# Altium footprint library 10A_Motor_Driver.PcbLib: 68 footprints (part 1 of 5)
Each footprint in its own frame and in the unit in brackets; x right, y up, seen from the top. Pads: shape width x height; smd on the part's side, far side on the other; paste and mask are expansions set on the pad; w line width, h text height; cw(c..) or ccw(c..) is an arc to the next point about the centre after c.
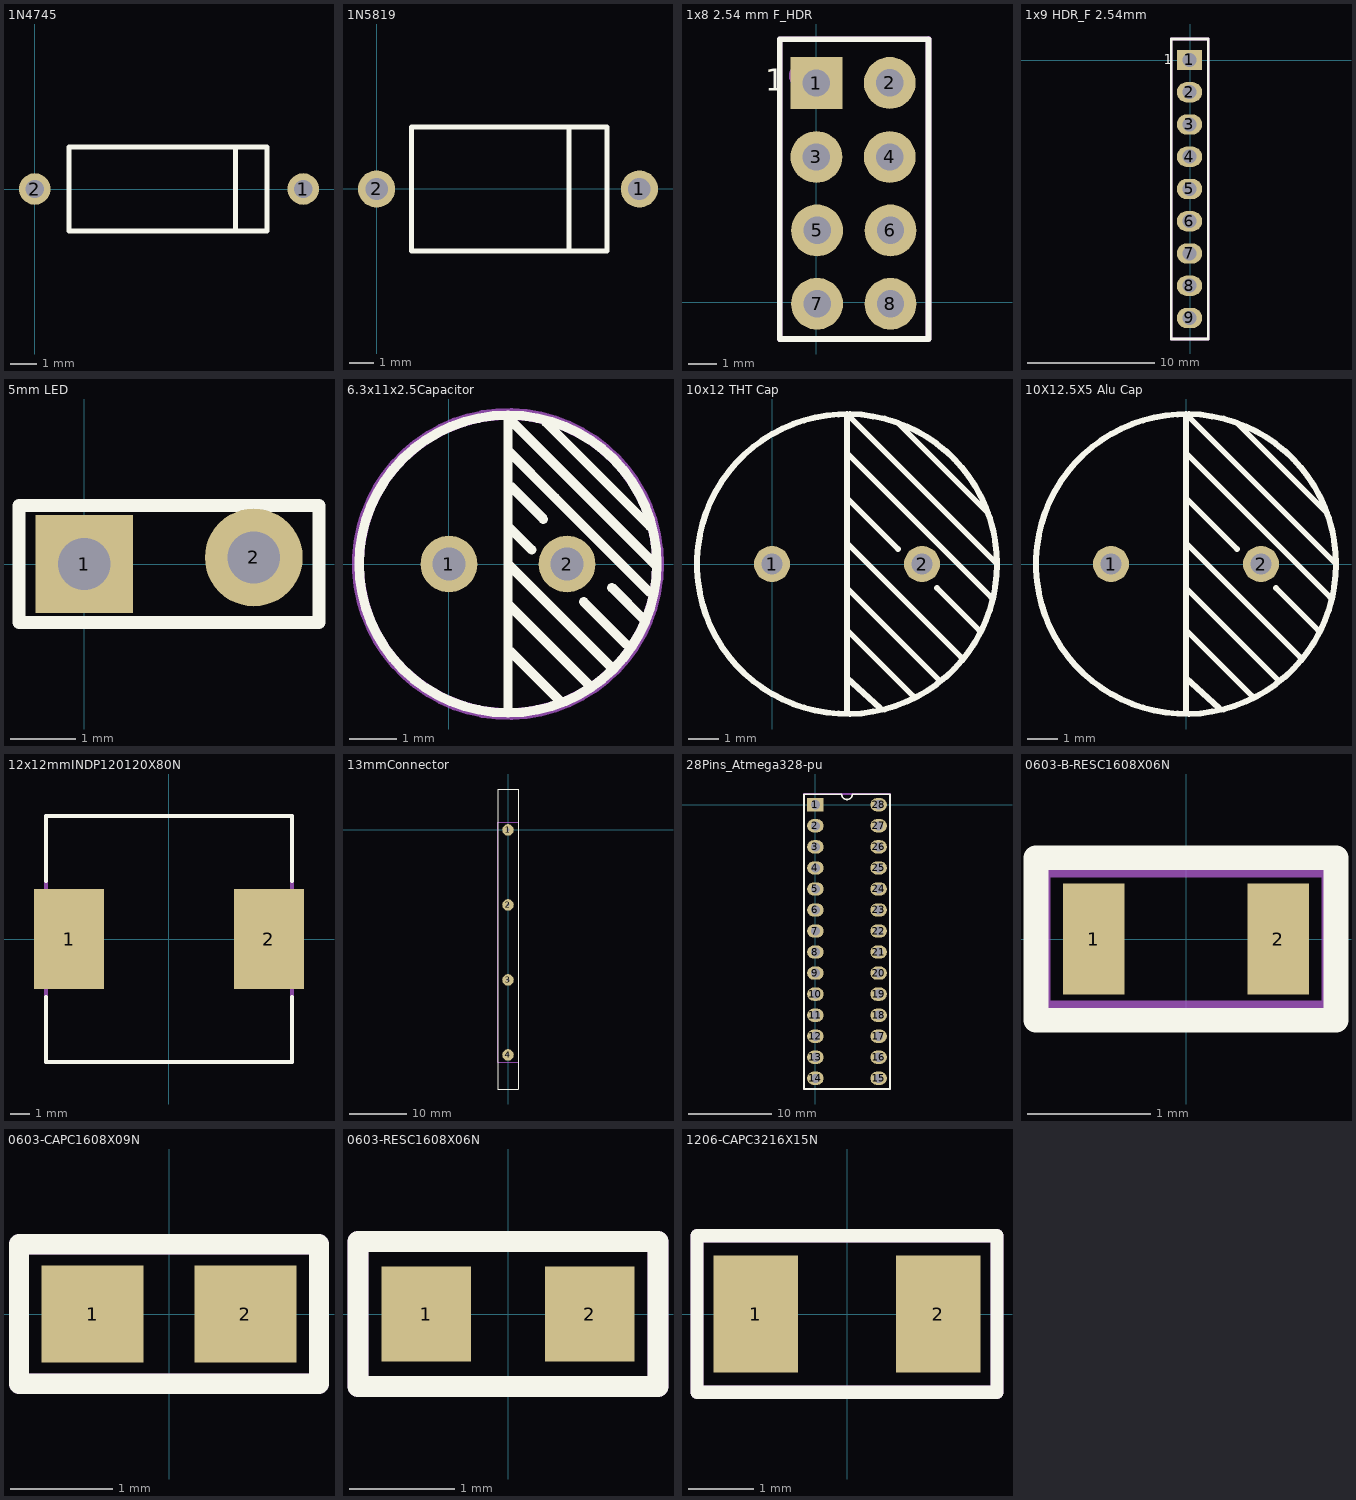
[diagram p0: the footprints below, top view; thin cyan lines are the x and y axes]

## 1N4745 [mm]
pads (2):
  round 1.2 hole 0.7: 1(10.2,0) 2(0,0)
Top Overlay:
  lines w0.2: 7.625,-1.6 7.625,1.6 ; 1.3,-1.6 8.825,-1.6 8.825,1.6 1.3,1.6 1.3,-1.6
3D body "User Library-Silicone Diode 3_9x2_6.step": height 2.83, standoff -1.28, extent -0.3,-1.352 10.42,1.3

## 1N5819 [mm]
pads (2):
  round 1.5 hole 0.9: 1(10.6,0) 2(0,0)
Top Overlay:
  lines w0.2: 7.758,-2.5 7.758,2.5 ; 1.4,-2.5 9.3,-2.5 9.3,2.5 1.4,2.5 1.4,-2.5
3D body "User Library-1N5819.step": height 5.08, standoff -2.28, extent -0.4,-2.35 11.02,2.4

## 1x8 2.54 mm F_HDR [mm]
pads (8):
  rect 1.8x1.8 hole 0.95: 1(0,7.62)
  round 1.8 hole 0.95: 2(2.55,7.625) 3(0,5.05) 4(2.55,5.05) 5(0.025,2.5) 6(2.575,2.5) 7(0.025,-0.05) 8(2.575,-0.05)
Top Overlay:
  lines w0.2: -1.27,-1.275 -1.27,9.144 3.9,9.144 3.9,-1.275 -1.27,-1.275
  text "1" at -1.771,7.349 h0.76
Top Assembly (Mech29):
  circle w0.381: c-0.508,7.874 r0.254
  lines w0.2: -1.275,9.144 -1.275,-1.275 3.9,-1.275 3.9,9.15 ; -1.27,9.144 3.9,9.144
  text ".Designator" at 1.575,-0.375 h0.9
3D body "User Library-2_54mm Male Header (4x2).STEP": height 9.34, standoff -2.2, extent -1.175,-1.305 3.805,8.855

## 1x9 HDR_F 2.54mm [mm]
pads (9):
  rect 2x1.6 hole 1.1: 1(-0.05,0.025)
  oval 2x1.6 hole 1.1: 2(-0.05,-2.515) 3(-0.05,-5.055) 4(-0.05,-7.595) 5(-0.05,-10.135) 6(-0.05,-12.675) 7(-0.05,-15.215) 8(-0.05,-17.755) 9(-0.05,-20.295)
Top Overlay:
  lines w0.2: -1.475,-21.95 -1.475,1.675 1.425,1.675 1.425,-21.95 -1.475,-21.95
  text "1" at -2.071,-0.321 h0.76
Top Assembly (Mech29):
  lines w0.2: -1.475,-21.95 1.425,-21.95 1.425,1.675 -1.475,1.675 -1.475,-21.95
3D body "User Library-zl262-9s_p2-54_l23-36_w2-54_h8-5.step": height 8.51, standoff -2.99, extent -1.32,-21.81 1.22,1.55

## 5mm LED [mm]
pads (2):
  rect 1.5x1.5 hole 0.8: 1(0,0)
  round 1.5 hole 0.8: 2(2.6,0.1)
Top Overlay:
  lines w0.2: -1,-0.9 -1,0.9 3.6,0.9 3.6,-0.9 -1,-0.9
3D body "User Library-red_5mm.step": height 13.7, standoff -21.25, extent -1.624,-2.8 3.824,3

## 6.3x11x2.5Capacitor [mm]
pads (2):
  round 1.2 hole 0.7: 1(0,0) 2(2.5,0)
Top Overlay:
  circle w0.2: c1.25,0 r3.15
  lines w0.2: 1.25,-3.1 1.25,0 ; 1.25,-0.85 2.975,-2.575 ; 1.25,0.9 1.25,0.8 1.75,0.3 ; 1.25,2.4 2.25,1.4 4.25,-0.6 ; 1.3,-1.85 2.35,-2.9 ; 1.3,1.65 2,0.95 ; 2.05,3 4.25,0.8 ; 2.85,-0.8 3.75,-1.7 ; 3.45,-2.2 1.25,0 ; 3.45,-0.5 4.15,-1.2 ; 4.35,0 1.25,3.1 1.25,0
Top Assembly (Mech29):
  circle w0.254: c1.25,0 r3.175
  text ".Designator" at 0.5,-1.367 h1
3D body "User Library-Cap-EL(6_3x11-2_5).step": height 11, standoff -3.2, extent -1.9,-3.149 4.402,3.149

## 10x12 THT Cap [mm]
pads (2):
  round 1.2 hole 0.7: 1(0,0) 2(5,0)
Top Overlay:
  circle w0.2: c2.5,0 r5
  lines w0.2: 2.5,-4.9 2.5,5 7.5,0 ; 2.5,-3.8 3.6,-4.8 ; 2.5,-0.8 5.6,-3.9 ; 2.5,0.7 6.3,-3.1 ; 2.5,2.2 4.2,0.5 ; 2.5,3.7 7.3,-1.1 ; 4.2,4.7 7.2,1.7 ; 4.7,-4.4 2.5,-2.2 ; 5.5,-0.8 6.9,-2.2 ; 2.5,-2.2 2.5,-2.2
Top Assembly (Mech29):
  text ".Designator" at 1.9,-0.234 h2
3D body "User Library-Cap-EL(10x12-5)T.step": height 12.9, standoff -3.1, extent -2.46,-4.997 7.542,4.998

## 10X12.5X5 Alu Cap [mm]
pads (2):
  round 1.2 hole 0.7: 1(-2.5,0) 2(2.5,0)
Top Overlay:
  circle w0.2: c0,0 r5
  lines w0.2: 0,-4.9 0,5 5,0 ; 0,-3.8 1.1,-4.8 ; 0,-0.8 3.1,-3.9 ; 0,0.7 3.8,-3.1 ; 0,2.2 1.7,0.5 ; 0,3.7 4.8,-1.1 ; 1.7,4.7 4.7,1.7 ; 2.2,-4.4 0,-2.2 ; 3,-0.8 4.4,-2.2 ; 0,-2.2 0,-2.2
Top Assembly (Mech29):
  text ".Designator" at -1.3,-0.834 h2
3D body "User Library-Cap-EL(10x12-5)T (1).step": height 12.8, standoff -3.2, extent -4.96,-4.997 5.042,4.998

## 12x12mmINDP120120X80N [mm] "Precision Wire Wound Inductor, 2-Leads, Body 12,00x12,00mm, IPC Medium Density"
height 8
pads (2):
  rect 3.55x5.1 smd: 1(-5.075,0) 2(5.075,0)
Top Overlay:
  lines w0.2: -6.25,-2.95 -6.25,-6.25 6.25,-6.25 6.25,-2.95 ; -6.25,2.95 -6.25,6.25 6.25,6.25 6.25,2.95
Top Assembly (Mech29):
  lines w0.2: -6.25,-6.25 -6.25,6.25 6.25,6.25 6.25,-6.25 -6.25,-6.25
3D body "12x12mmINDP120120X80N.step": height 8.1, standoff 0, extent -6.1,-6 6.1,6

## 13mmConnector [mm]
pads (4):
  round 2 hole 0.6: 1(0,0) 2(0,-13) 3(0,-26) 4(0,-39)
Top Overlay:
  lines w0.2: -1.778,-44.9 1.778,-44.9 1.778,7.1 -1.778,7.1 -1.778,-44.9
Top Assembly (Mech29):
  lines w0.2: -1.775,-40.3 -1.775,1.3 1.775,1.3 1.775,-40.3 -1.775,-40.3
  text ".Designator" at 0.274,-21.165 h2

## 28Pins_Atmega328-pu [mm]
pads (28):
  rect 2x1.6 hole 1.1: 1(0,0)
  oval 2x1.6 hole 1.1: 2(0,-2.54) 3(0,-5.08) 4(0,-7.62) 5(0,-10.16) 6(0,-12.7) 7(0,-15.24) 8(0,-17.78) 9(0,-20.32) 10(0,-22.86) 11(0,-25.4) 12(0,-27.94) 13(0,-30.48) 14(0,-33.02) 15(7.62,-33.02) 16(7.62,-30.48) 17(7.62,-27.94) 18(7.62,-25.4) 19(7.62,-22.86) 20(7.62,-20.32) 21(7.62,-17.78) 22(7.62,-15.24) 23(7.62,-12.7) 24(7.62,-10.16) 25(7.62,-7.62) 26(7.62,-5.08) 27(7.62,-2.54) 28(7.62,0)
Top Overlay:
  lines w0.2: -1.39,-34.31 9.01,-34.31 9.01,1.27 4.445,1.27 cw(c3.81,1.27) 3.175,1.27 -1.39,1.27 -1.39,-34.31
Top Assembly (Mech29):
  circle w0.5: c0,0 r0.29
  lines w0.254: -1.39,-34.31 -1.39,1.29 4.41,1.29 4.61,1.29 6.31,1.29 9.01,1.29 9.01,-34.31 -1.39,-34.31
  text ".Designator" at 4.586,-18.185 h3
3D body "User Library-User Library-ATmega 48_88_168_328 28P3_90DEG.step": height 7.94, standoff 0.82, extent -0.143,-33.76 7.763,0.89

## 28Pins_SOCKETS [mm]
3D body "dil_socket.stp": height 4.2, standoff -3.17, extent -1.24,-34.26 8.86,1.24

## 0603-B-RESC1608X06N [mm] "Chip Resistor, 2-Leads, Body 1,60x0,85mm, IPC Medium Density"
height 0.55
pads (2):
  rect 0.5x0.9 smd: 1(-0.75,0) 2(0.75,0)
Top Overlay:
  lines w0.2: -1.219,-0.66 -1.219,0.66 1.219,0.66 1.219,-0.66 -1.219,-0.66
Top Assembly (Mech29):
  lines w0.2: -1.2,-0.6 1.2,-0.6 1.2,0.6 -1.2,0.6 -1.2,-0.6
  text ".Designator" at -0.01,-0.077 h0.4
3D body "0603-B-RESC1608X06N.step": height 0.55, standoff 0, extent -0.85,-0.475 0.85,0.475

## 0603-CAPC1608X09N [mm] "Chip Capacitor, 2-Leads, Body 1,60x0,80mm, IPC Medium Density"
height 0.9
pads (2):
  rect 1x0.95 smd: 1(-0.75,0) 2(0.75,0)
Top Overlay:
  lines w0.2: -1.473,-0.686 -1.473,0.686 1.473,0.686 1.473,-0.686 -1.473,-0.686
Top Assembly (Mech29):
  lines w0.2: -1.473,-0.686 1.473,-0.686 1.473,0.686 -1.473,0.686 -1.473,-0.686
  text ".Designator" at -0.012,-0.031 h0.4
3D body "0603-CAPC1608X09N.step": height 0.9, standoff 0, extent -0.85,-0.45 0.85,0.45

## 0603-RESC1608X06N [mm] "Chip Resistor, 2-Leads, Body 1,60x0,80mm, IPC Medium Density"
height 0.55
pads (2):
  rect 0.85x0.9 smd: 1(-0.775,0) 2(0.775,0)
Top Overlay:
  lines w0.2: -1.422,-0.686 -1.422,0.686 1.422,0.686 1.422,-0.686 -1.422,-0.686
Top Assembly (Mech29):
  lines w0.2: -1.422,-0.686 -1.422,0.686 1.422,0.686 1.422,-0.686 -1.422,-0.686
  text ".Designator" at -0.037,-0.031 h0.4
3D body "User Library-R0603-1.step": height 0.46, standoff 0.01, extent -0.95,-0.4 0.95,0.4

## 1206-CAPC3216X15N [mm] "Chip Capacitor, 2-Leads, Body 3,20x1,60mm, IPC Medium Density"
height 1.52
pads (2):
  rect 1.3x1.8 smd: 1(-1.4,0) 2(1.4,0)
Top Overlay:
  lines w0.2: -2.3,-1.2 -2.3,1.2 2.3,1.2 2.3,-1.2 -2.3,-1.2
Top Assembly (Mech29):
  lines w0.2: -2.3,-1.2 2.3,-1.2 2.3,1.2 -2.3,1.2 -2.3,-1.2
  text ".Designator" at -1.4,-0.367 h1
3D body "1206-CAPC3216X15N.step": height 1.52, standoff 0, extent -1.7,-0.9 1.7,0.9